# Altium footprint library DriverBoard.PcbLib: 24 footprints (part 2 of 2)
Each footprint in its own frame and in the unit in brackets; x right, y up, seen from the top. Pads: shape width x height; smd on the part's side, far side on the other; paste and mask are expansions set on the pad; w line width, h text height; cw(c..) or ccw(c..) is an arc to the next point about the centre after c.
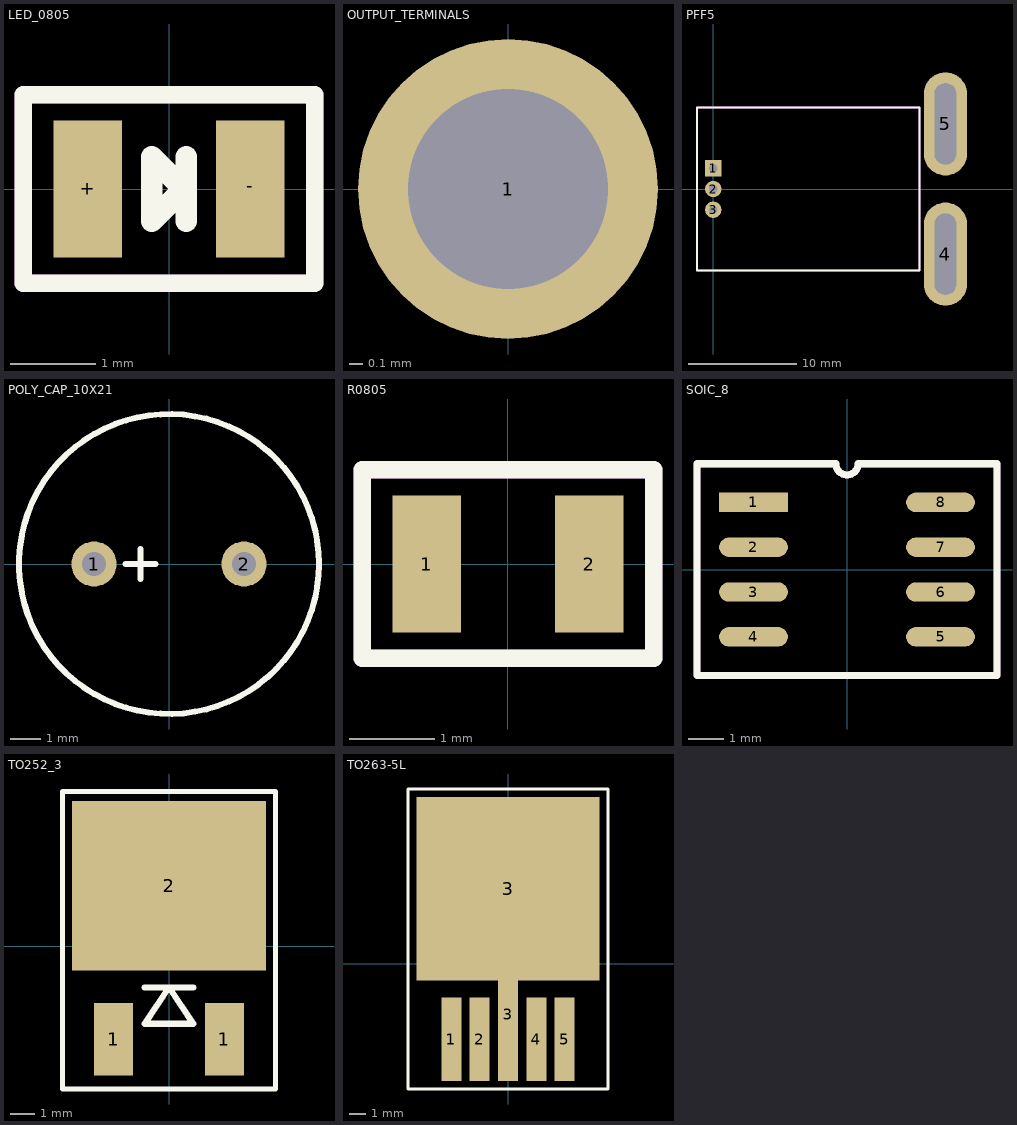
[diagram p1: the footprints below, top view; thin cyan lines are the x and y axes]

## LED_0805 [mm]
pads (2):
  rect 0.8x1.6 smd: +(-0.95,0) -(0.95,0)
Top Overlay:
  lines w0.2: -1.7,-1.1 1.7,-1.1 1.7,1.1 -1.7,1.1 -1.7,-1.1
  lines w0.254: 0.2,-0.375 0.2,0.375 ; -0.2,-0.375 0.175,0 -0.2,0.375 -0.2,-0.375
Mechanical 29:
  lines w0.2: -1.7,-1.1 1.7,-1.1 1.7,1.1 -1.7,1.1 -1.7,-1.1
  text "'.Designator'" at -1.3,-0.4 h0.5
3D body "LED_0805.step": height 1.1, standoff 0, extent -1.01,-0.625 1.01,0.625

## OUTPUT_TERMINALS [mm]
pads (1):
  round 2.25 hole 1.5: 1(0,0)

## PFF5 [mm]
pads (5):
  rect 1.5x1.5 hole 0.8: 1(0,1.91)
  round 1.5 hole 0.8: 2(0,0) 3(0,-1.91)
  oval 4x9.5 hole 2 slot 7.5 at 90 deg: 4(21.4,-6) 5(21.4,6)
Top Overlay:
  lines w0.2: -1.5,-7.5 19,-7.5 19,7.5 -1.5,7.5 -1.5,-7.5
Mechanical 29:
  lines w0.2: -1.5,-7.5 -1.5,7.5 19,7.5 19,-7.5 -1.5,-7.5
  text "'.Designator'" at 1.45,-1.15 h2
3D body "PFF_5LEAD.STEP": height 7.01, standoff -3.47, extent -0.2,-7 22.21,7

## POLY_CAP_10X21 [mm]
pads (2):
  round 1.5 hole 0.8: 1(-2.5,0) 2(2.5,0)
Top Overlay:
  circle w0.2: c0,0 r5
  lines w0.2: -1.458,0 -0.442,0 ; -0.95,-0.508 -0.95,0.508
3D body "CAPAER_D100_L215_P050_W006X030.STEP": height 21.53, standoff -2.99, extent -5,-5 5.01,5

## R0805 [mm]
pads (2):
  rect 0.8x1.6 smd: 1(-0.95,0) 2(0.95,0)
Top Overlay:
  lines w0.2: -1.7,-1.1 -1.7,1.1 1.7,1.1 1.7,-1.1 -1.7,-1.1
Mechanical 29:
  lines w0.2: -1.7,-1.1 1.7,-1.1 1.7,1.1 -1.7,1.1 -1.7,-1.1
  text ".Designator" at -1.2,-0.5 h0.8
3D body "RES_0805.step": height 0.61, standoff 0.01, extent -1,-0.625 1,0.625

## SOIC_8 [mm]
pads (8):
  rect 1.95x0.55 smd: 1(-2.65,1.905)
  oval 1.95x0.55 smd: 2(-2.65,0.635) 3(-2.65,-0.635) 4(-2.65,-1.905) 5(2.65,-1.905) 6(2.65,-0.635) 7(2.65,0.635) 8(2.65,1.905)
Top Overlay:
  lines w0.2: -4.25,-3 -4.25,3 -0.318,3 ccw(c0,3) 0.318,3 4.25,3 4.25,-3 -4.25,-3
Mechanical 29:
  lines w0.2: -4.25,-3 4.25,-3 4.25,3 0.318,3 cw(c0,3) -0.318,3 -4.25,3 -4.25,-3
  text "'.Designator'" at -3.2,-0.5 h1
3D body "SOIC_8.step": height 1.75, standoff 0, extent -3,-2.45 3,2.45

## TO252_3 [mm]
pads (3):
  rect 1.6x3 smd: 1(-2.29,-3.85) 1(2.29,-3.85)
  rect 8x7 smd: 2(0,2.5)
Top Overlay:
  lines w0.2: -4.4,-5.9 4.4,-5.9 4.4,6.4 -4.4,6.4 -4.4,-5.9
  lines w0.254: -1,-1.7 1,-1.7 ; -1,-3.2 1,-3.2 0,-1.7 -1,-3.2
3D body "User Library-DPAK_TO-252AA.step": height 2.41, standoff 0.01, extent -3.367,-4.698 3.367,5.402

## TO263-5L [mm]
pads (6):
  rect 1.2x5 smd: 1(-3.4,-4.525) 2(-1.7,-4.525) 4(1.7,-4.525) 5(3.4,-4.525)
  rect 1.2x8 smd: 3(0,-3.025)
  rect 11x11 smd: 3(0,4.525)
Top Overlay:
  lines w0.2: -6,-7.5 -6,10.5 6,10.5 6,-7.5 -6,-7.5
3D body "User Library-TO263-5.STEP": height 4.81, standoff 0.01, extent -5,-6.49 5,9.18